# Altium footprint library Footprints.PcbLib: 158 footprints (part 1 of 10)
Each footprint in its own frame and in the unit in brackets; x right, y up, seen from the top. Pads: shape width x height; smd on the part's side, far side on the other; paste and mask are expansions set on the pad; w line width, h text height; cw(c..) or ccw(c..) is an arc to the next point about the centre after c.
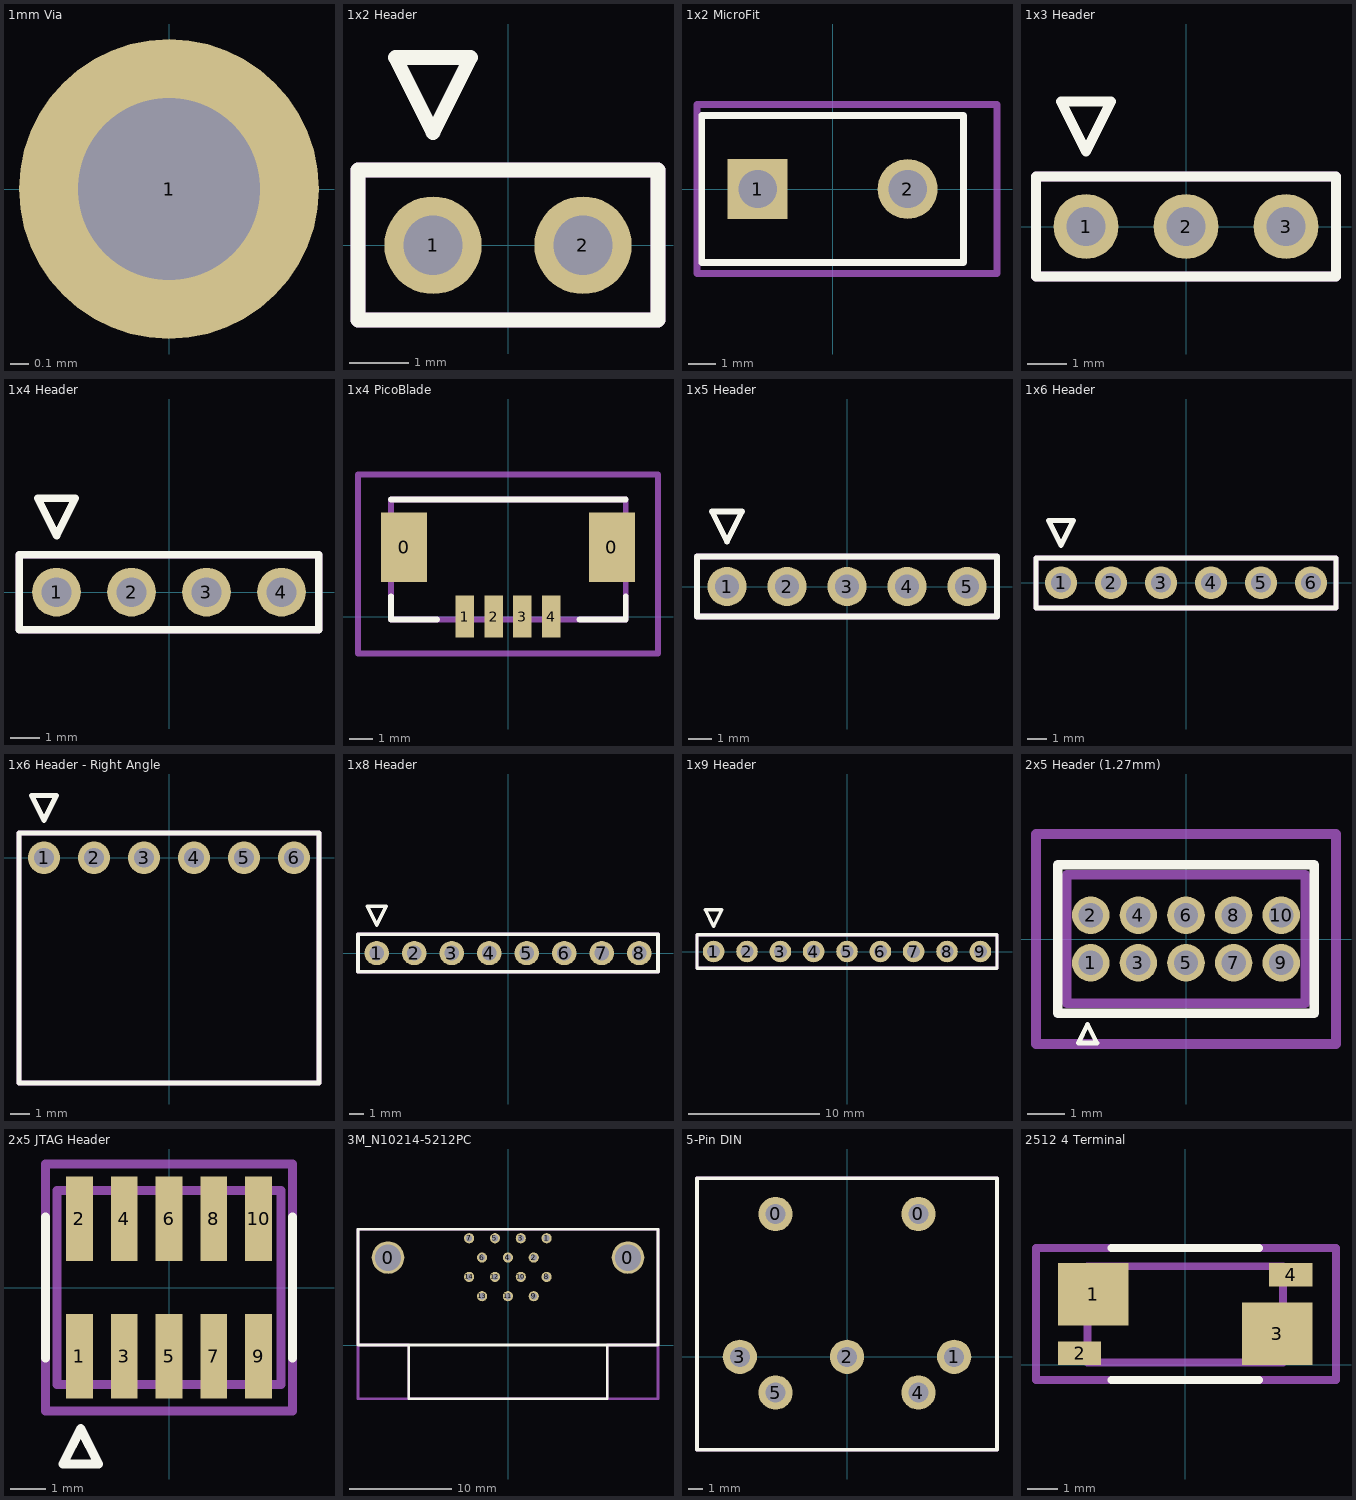
[diagram p0: the footprints below, top view; thin cyan lines are the x and y axes]

## 1mm Via [mm]
pads (1):
  round 1.65 hole 1 mask+0.102: 1(0,0)

## 1x2 Header [mm]
pads (2):
  round 1.65 hole 1 mask+0.102: 1(-1.27,0) 2(1.27,0)
Top Overlay:
  lines w0.254: -2.54,-1.27 2.54,-1.27 2.54,1.27 -2.54,1.27 -2.54,-1.27 ; -1.905,3.175 -0.635,3.175 -1.27,1.905 -1.905,3.175
Mechanical 13:
  lines w0.254: -2.54,-1.27 2.54,-1.27 2.54,1.27 -2.54,1.27 -2.54,-1.27
Mechanical 15:
  lines w0.254: -2.54,-1.27 2.54,-1.27 2.54,1.27 -2.54,1.27 -2.54,-1.27
3D body: height 8.59, standoff -2.39, extent -2.54,-1.27 2.54,1.27

## 1x2 MicroFit [mm] "1x2 Molex MicroFit"
height 9.6
pads (2):
  rect 2.2x2.2 hole 1.4 mask+0.102: 1(-2.75,0)
  round 2.2 hole 1.4 mask+0.102: 2(2.75,0)
Top Overlay:
  lines w0.254: -4.8,-2.7 -4.8,2.7 4.8,2.7 4.8,-2.7 -4.8,-2.7
Mechanical 13:
  lines w0.254: -4.975,-3.1 -4.975,3.1 6.025,3.1 6.025,-3.1 -4.975,-3.1
Mechanical 15:
  lines w0.254: -4.975,-3.1 6.025,-3.1 6.025,3.1 -4.975,3.1 -4.975,-3.1
3D body: height 12.8, standoff -3.5, extent -4.975,-3.1 6.025,3.1

## 1x3 Header [mm]
pads (3):
  round 1.65 hole 1 mask+0.102: 1(-2.54,0) 2(0,0) 3(2.54,0)
Top Overlay:
  lines w0.254: -3.81,-1.27 -3.81,1.27 3.81,1.27 3.81,-1.27 -3.81,-1.27 ; -3.175,3.175 -2.54,1.905 -1.905,3.175 -3.175,3.175
Mechanical 13:
  lines w0.254: -3.81,-1.27 -3.81,1.27 3.81,1.27 3.81,-1.27 -3.81,-1.27
Mechanical 15:
  lines w0.254: -3.81,-1.27 -3.81,1.27 3.81,1.27 3.81,-1.27 -3.81,-1.27
3D body: height 18.71, standoff -3.65, extent -3.81,-1.27 3.81,1.27

## 1x4 Header [mm]
pads (4):
  round 1.65 hole 1 mask+0.102: 1(-3.81,0) 2(-1.27,0) 3(1.27,0) 4(3.81,0)
Top Overlay:
  lines w0.254: -5.08,-1.27 5.08,-1.27 5.08,1.27 -5.08,1.27 -5.08,-1.27 ; -4.445,3.175 -3.81,1.905 -3.175,3.175 -4.445,3.175
Mechanical 13:
  lines w0.254: -5.08,-1.27 5.08,-1.27 5.08,1.27 -5.08,1.27 -5.08,-1.27
Mechanical 15:
  lines w0.254: -5.08,-1.27 5.08,-1.27 5.08,1.27 -5.08,1.27 -5.08,-1.27
3D body: height 18.71, standoff -3.65, extent -5.08,-1.27 5.08,1.27

## 1x4 PicoBlade [mm]
height 3.4
pads (6):
  rect 2x3 smd: 0(-4.5,3) 0(4.5,3)
  rect 0.8x1.8 smd: 1(-1.875,0) 2(-0.625,0) 3(0.625,0) 4(1.875,0)
Top Overlay:
  lines w0.254: -5.075,0.875 -5.075,-0.125 -3.075,-0.125 ; -5.075,5.075 5.1,5.075 ; 3.1,-0.125 5.1,-0.125 5.1,0.875
Mechanical 13:
  lines w0.254: -5.075,-0.125 -5.075,5.075 5.1,5.075 5.1,-0.125 -5.075,-0.125
Mechanical 15:
  lines w0.254: -6.5,-1.6 6.5,-1.6 6.5,6.15 -6.5,6.15 -6.5,-1.6
3D body: height 3.4, standoff 0, extent -5.05,-0.125 5.1,5.075

## 1x5 Header [mm]
pads (5):
  round 1.65 hole 1 mask+0.102: 1(-5.08,0) 2(-2.54,0) 3(0,0) 4(2.54,0) 5(5.08,0)
Top Overlay:
  lines w0.254: -6.35,-1.27 6.35,-1.27 6.35,1.27 -6.35,1.27 -6.35,-1.27 ; -5.715,3.175 -5.08,1.905 -4.445,3.175 -5.715,3.175
Mechanical 13:
  lines w0.254: -6.35,-1.27 6.35,-1.27 6.35,1.27 -6.35,1.27 -6.35,-1.27
Mechanical 15:
  lines w0.254: -6.35,-1.27 6.35,-1.27 6.35,1.27 -6.35,1.27 -6.35,-1.27
3D body: height 18.71, standoff -3.65, extent -6.35,-1.27 6.35,1.27

## 1x6 Header [mm]
pads (6):
  round 1.65 hole 1 mask+0.102: 1(-6.35,0) 2(-3.81,0) 3(-1.27,0) 4(1.27,0) 5(3.81,0) 6(6.35,0)
Top Overlay:
  lines w0.254: -7.62,-1.27 -7.62,1.27 7.62,1.27 7.62,-1.27 -7.62,-1.27 ; -6.985,3.175 -6.35,1.905 -5.715,3.175 -6.985,3.175
Mechanical 13:
  lines w0.254: -7.62,-1.27 -7.62,1.27 7.62,1.27 7.62,-1.27 -7.62,-1.27
Mechanical 15:
  lines w0.254: -7.62,-1.27 -7.62,1.27 7.62,1.27 7.62,-1.27 -7.62,-1.27
3D body: height 18.71, standoff -3.65, extent -7.62,-1.27 7.62,1.27

## 1x6 Header - Right Angle [mm]
pads (6):
  round 1.65 hole 1 mask+0.102: 1(-6.35,0) 2(-3.81,0) 3(-1.27,0) 4(1.27,0) 5(3.81,0) 6(6.35,0)
Top Overlay:
  lines w0.254: -7.62,-11.43 -7.62,1.27 7.62,1.27 7.62,-11.43 -7.62,-11.43 ; -6.985,3.175 -6.35,1.905 -5.715,3.175 -6.985,3.175
Mechanical 13:
  lines w0.254: -7.62,-11.43 -7.62,1.27 7.62,1.27 7.62,-11.43 -7.62,-11.43
Mechanical 15:
  lines w0.254: -7.62,-11.43 -7.62,1.27 7.62,1.27 7.62,-11.43 -7.62,-11.43
3D body: height 2.74, standoff -2.79, extent -7.62,-10.293 7.62,0.286

## 1x8 Header [mm]
pads (8):
  round 1.65 hole 1 mask+0.102: 1(-8.89,0) 2(-6.35,0) 3(-3.81,0) 4(-1.27,0) 5(1.27,0) 6(3.81,0) 7(6.35,0) 8(8.89,0)
Top Overlay:
  lines w0.254: -10.16,-1.27 -10.16,1.27 10.16,1.27 10.16,-1.27 -10.16,-1.27 ; -9.525,3.175 -8.255,3.175 -8.89,1.905 -9.525,3.175
Mechanical 13:
  lines w0.254: -10.16,-1.27 -10.16,1.27 10.16,1.27 10.16,-1.27 -10.16,-1.27
Mechanical 15:
  lines w0.254: -10.16,-1.27 -10.16,1.27 10.16,1.27 10.16,-1.27 -10.16,-1.27
3D body: height 18.71, standoff -3.65, extent -10.16,-1.27 10.16,1.27

## 1x9 Header [mm]
pads (9):
  round 1.65 hole 1 mask+0.102: 1(-10.16,0) 2(-7.62,0) 3(-5.08,0) 4(-2.54,0) 5(0,0) 6(2.54,0) 7(5.08,0) 8(7.62,0) 9(10.16,0)
Top Overlay:
  lines w0.254: -11.43,-1.27 -11.43,1.27 11.43,1.27 11.43,-1.27 -11.43,-1.27 ; -10.795,3.175 -9.525,3.175 -10.16,1.905 -10.795,3.175
Mechanical 13:
  lines w0.254: -11.43,-1.27 -11.43,1.27 11.43,1.27 11.43,-1.27 -11.43,-1.27
Mechanical 15:
  lines w0.254: -11.43,-1.27 -11.43,1.27 11.43,1.27 11.43,-1.27 -11.43,-1.27
3D body: height 18.81, standoff -3.55, extent -11.43,-1.27 11.43,1.27

## 2x5 Header (1.27mm) [mm]
height 5.55
pads (10):
  round 1 hole 0.65: 1(-2.54,-0.635) 2(-2.54,0.635) 3(-1.27,-0.635) 4(-1.27,0.635) 5(0,-0.635) 6(0,0.635) 7(1.27,-0.635) 8(1.27,0.635) 9(2.54,-0.635) 10(2.54,0.635)
Top Overlay:
  lines w0.127: -2.875,-2.775 -2.625,-2.275 -2.375,-2.775 -2.875,-2.775
  lines w0.254: -3.425,-1.975 -3.425,1.975 3.425,1.975 3.425,-1.975 -3.425,-1.975
Mechanical 13:
  lines w0.254: -3.175,-1.715 -3.175,1.715 3.175,1.715 3.175,-1.715 -3.175,-1.715
Mechanical 15:
  lines w0.254: -4,-2.8 4,-2.8 4,2.8 -4,2.8 -4,-2.8
3D body: height 5.5, standoff -2.35, extent -3.175,-1.715 3.175,1.685

## 2x5 JTAG Header [mm]
height 5.5
pads (10):
  rect 0.76x2.4 smd: 1(-2.54,-1.95) 2(-2.54,1.95) 3(-1.27,-1.95) 4(-1.27,1.95) 5(0,-1.95) 6(0,1.95) 7(1.27,-1.95) 8(1.27,1.95) 9(2.54,-1.95) 10(2.54,1.95)
Top Overlay:
  lines w0.254: -3.5,-2 -3.5,2 ; 3.5,-2 3.5,2 ; -3,-5 -2,-5 -2.5,-4 -3,-5
Mechanical 13:
  lines w0.254: -3.175,-2.75 -3.175,2.75 3.175,2.75 3.175,-2.75 -3.175,-2.75
Mechanical 15:
  lines w0.254: -3.5,-3.5 3.5,-3.5 3.5,3.5 -3.5,3.5 -3.5,-3.5
3D body: height 4.5, standoff 0, extent -3.175,-2.8 3.175,2.7

## 3M_N10214-5212PC [mm] "14-pin Mini-D Ribbon Connector"
height 11.4
pads (16):
  round 3.2 hole 2.6 mask+0.102: 0(-11.8,8.6) 0(11.8,8.6)
  round 1 hole 0.6 paste+0 mask+0.102: 1(3.8,10.5) 2(2.53,8.6) 3(1.26,10.5) 4(-0.01,8.6) 5(-1.28,10.5) 6(-2.55,8.6) 7(-3.82,10.5) 8(3.8,6.7) 9(2.53,4.8) 10(1.26,6.7) 11(-0.01,4.8) 12(-1.28,6.7) 13(-2.55,4.8) 14(-3.82,6.7)
Top Overlay:
  lines w0.254: -9.75,0 -9.75,-5.3 9.75,-5.3 9.75,0 ; -14.75,0 14.75,0 14.75,11.4 -14.75,11.4 -14.75,0
Mechanical 13:
  lines w0.254: -14.75,0 -9.75,0 -9.75,-5.3 9.75,-5.3 9.75,0 14.75,0 14.75,11.4 -14.75,11.4 -14.75,0
Mechanical 15:
  lines w0.254: -14.75,-5.3 14.75,-5.3 14.75,11.4 -14.75,11.4 -14.75,-5.3
3D body: height 0, standoff -3.8, extent 3.602,10.3 4,10.7
3D body: height 0, standoff -3.8, extent 1.062,10.301 1.46,10.7
3D body: height 0, standoff -3.8, extent -1.478,10.301 -1.08,10.7
3D body: height 0, standoff -3.8, extent -4.018,10.3 -3.62,10.7
3D body: height 0, standoff -3.8, extent -2.748,8.401 -2.35,8.8
3D body: height 0, standoff -3.8, extent -0.208,8.401 0.19,8.8
3D body: height 0, standoff -3.8, extent 2.332,8.401 2.73,8.8
3D body: height 0, standoff -3.8, extent 3.602,6.501 4,6.9
3D body: height 0, standoff -3.8, extent 1.062,6.5 1.46,6.9
3D body: height 0, standoff -3.8, extent -1.478,6.501 -1.08,6.9
3D body: height 0, standoff -3.8, extent -4.018,6.5 -3.62,6.9
3D body: height 0, standoff -3.8, extent -2.748,4.601 -2.35,5
3D body: height 0, standoff -3.8, extent -0.208,4.601 0.19,5
3D body: height 0, standoff -3.8, extent 2.332,4.601 2.73,5
3D body: height 9.4, standoff 0, extent -14.75,0 14.75,11.4
3D body: height 2, standoff 0, extent -14.75,0 14.75,11.4
3D body: height 7.85, standoff 1.5, extent -9.75,-5.3 9.75,0

## 5-Pin DIN [mm]
height 19.5
pads (7):
  round 2.4 hole 1.4 mask+0.102: 0(-5,10) 0(5,10) 1(7.5,0) 2(0,0) 3(-7.5,0) 4(5,-2.5) 5(-5,-2.5)
Top Overlay:
  lines w0.254: -10.5,-6.5 10.5,-6.5 10.5,12.5 -10.5,12.5 -10.5,-6.5
Mechanical 13:
  lines w0.254: -10.5,-6.5 10.5,-6.5 10.5,12.5 -10.5,12.5 -10.5,-6.5
Mechanical 15:
  lines w0.254: -10.5,-6.5 10.5,-6.5 10.5,12.5 -10.5,12.5 -10.5,-6.5
3D body: height 19.5, standoff 0, extent -10.5,-6.5 10.5,12.5

## 2512 4 Terminal [mm]
height 0.76
pads (4):
  rect 2.29x2.03 smd: 1(-2.985,2.285) 3(2.985,1.015)
  rect 1.4x0.76 smd: 2(-3.43,0.38) 4(3.43,2.92)
Top Overlay:
  lines w0.254: -2.4,-0.5 2.4,-0.5 ; -2.4,3.8 2.4,3.8
Mechanical 13:
  lines w0.254: -3.175,0.075 3.175,0.075 3.175,3.2 -3.175,3.2 -3.175,0.075
Mechanical 15:
  lines w0.254: -4.85,-0.5 4.9,-0.5 4.9,3.8 -4.85,3.8 -4.85,-0.5
3D body: height 0.64, standoff 0.2, extent -1.375,0.075 1.375,3.2
3D body: height 0.64, standoff 0, extent 1.375,0.075 3.175,3.2
3D body: height 0.64, standoff 0, extent -3.175,0.075 -1.375,3.2